# Altium footprint library TG102LE4G_A7682_240822.PcbLib: 38 footprints (part 2 of 3)
Each footprint in its own frame and in the unit in brackets; x right, y up, seen from the top. Pads: shape width x height; smd on the part's side, far side on the other; paste and mask are expansions set on the pad; w line width, h text height; cw(c..) or ccw(c..) is an arc to the next point about the centre after c.
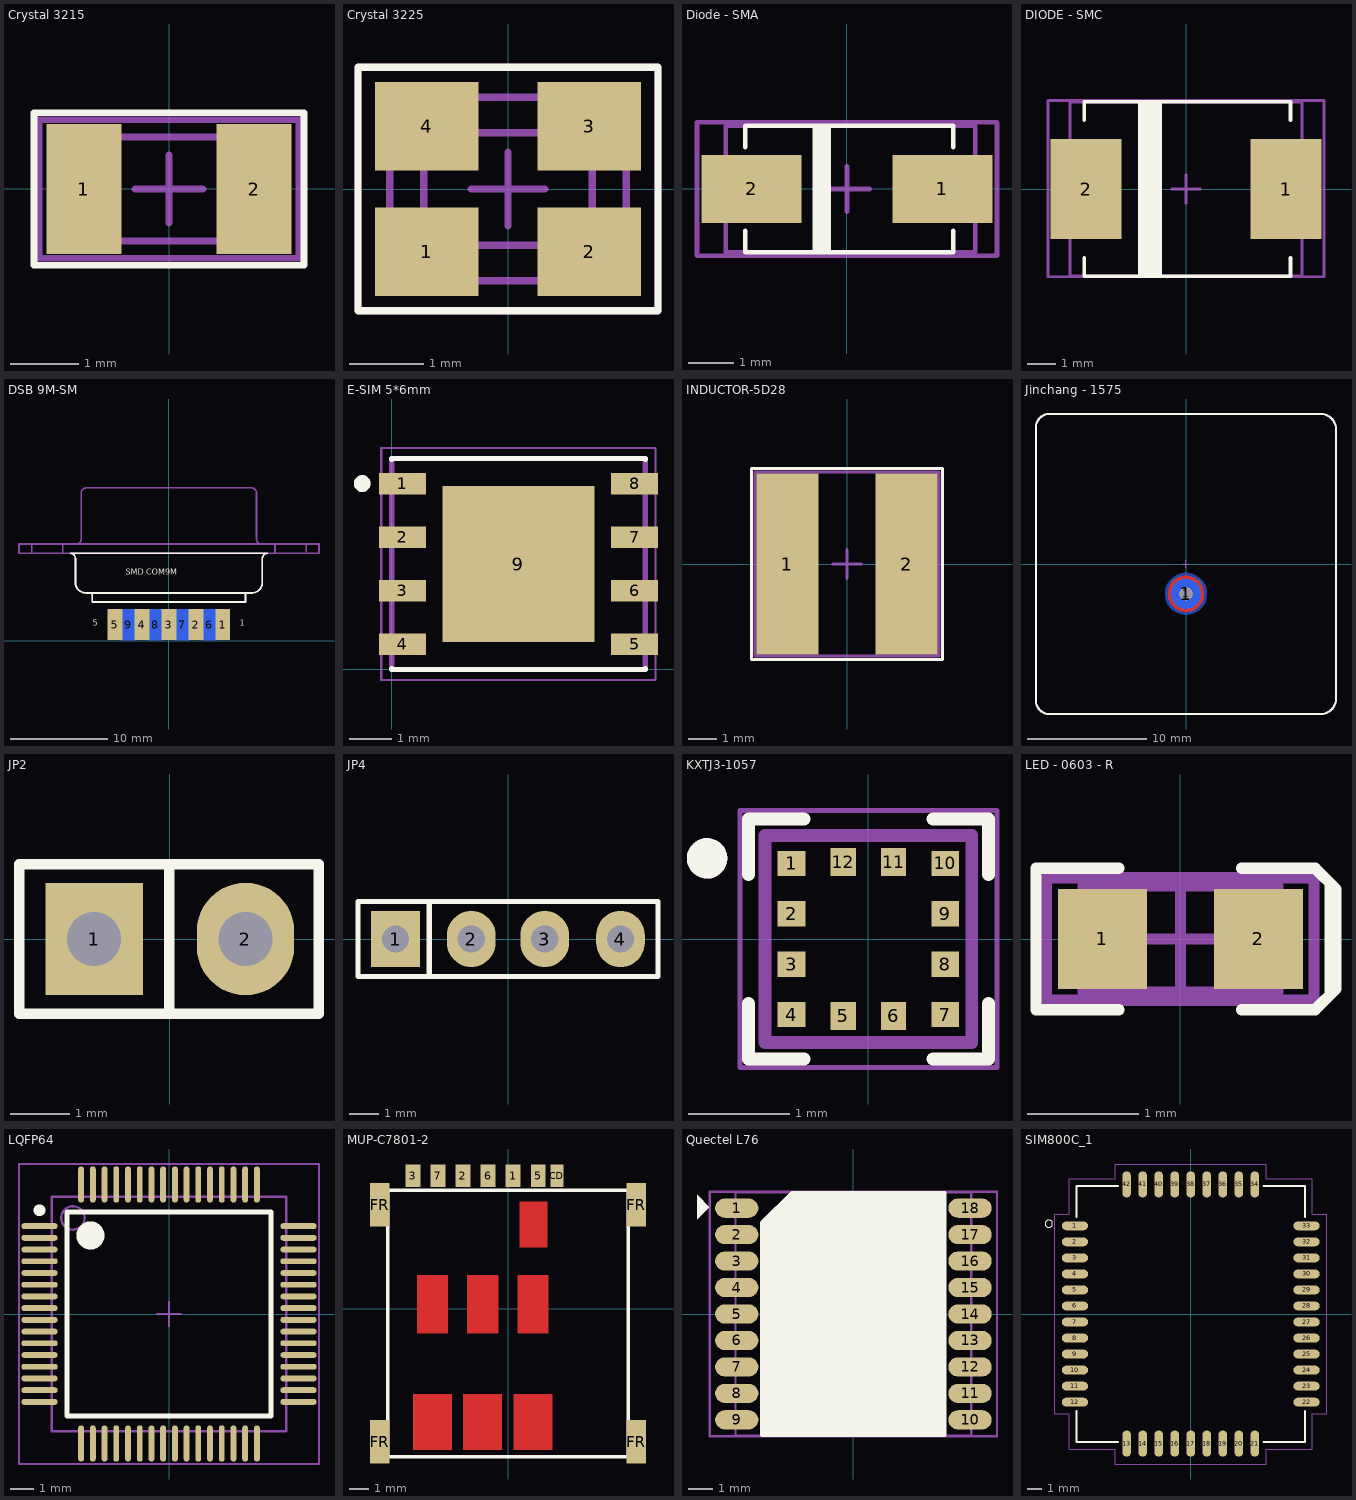
[diagram p1: the footprints below, top view; thin cyan lines are the x and y axes]

## Crystal 3215 [mm] "Surface Mount, crystal 2lead, 3.20mm x 1.50mm"
height 0.9
pads (2):
  rect 1.1x1.9 smd paste-0.05: 1(-1.25,0) 2(1.25,0)
Top Overlay:
  lines w0.1: -1.981,-1.118 1.981,-1.118 1.981,1.118 -1.981,1.118 -1.981,-1.118
Mechanical 13:
  lines w0.1: -1.524,-0.762 1.524,-0.762 1.524,0.762 -1.524,0.762 -1.524,-0.762
Mechanical 15:
  lines w0.1: -0.5,0 0.5,0 ; 0,-0.5 0,0.5 ; -1.905,-1.016 -1.905,1.016 1.905,1.016 1.905,-1.016 -1.905,-1.016
3D body "User Library-NDK_NX3215SA.STEP": height 0.8, standoff 0, extent -1.6,-0.75 1.6,0.75

## Crystal 3225 [mm] "Surface Mount,4-SMD, No Lead (DFN, LCC),3.20mm x 2.50mm"
height 1
pads (4):
  rect 1.4x1.2 smd paste-0.026: 1(-1.1,-0.85) 2(1.1,-0.85) 3(1.1,0.85) 4(-1.1,0.85)
Top Overlay:
  lines w0.1: -2.032,-1.651 -2.032,1.651 2.032,1.651 2.032,-1.651 -2.032,-1.651
Mechanical 13:
  lines w0.1: -1.6,-1.016 cw(c-1.6,-1.245) -1.372,-1.245 1.372,-1.245 cw(c1.6,-1.245) 1.6,-1.016 1.6,1.016 cw(c1.6,1.245) 1.372,1.245 -1.372,1.245 cw(c-1.6,1.245) -1.6,1.016 -1.6,-1.016 ; -1.143,-0.762 1.143,-0.762 1.143,0.762 -1.143,0.762 -1.143,-0.762
Mechanical 15:
  lines w0.1: -0.5,0 0.5,0 ; 0,-0.5 0,0.5 ; -2.032,-1.651 2.032,-1.651 2.032,1.651 -2.032,1.651 -2.032,-1.651
3D body "User Library-ABM8G.step": height 1.01, standoff 0, extent -1.6,-1.25 1.6,1.25

## Diode - SMA [mm] "Diode; 2 Leads"
pads (2):
  rect 2.2x1.5 smd: 1(2.1,0) 2(-2.1,0)
Top Overlay:
  rectangle: -0.711,-1.397 -0.356,1.397
  lines w0.1: -2.235,-0.914 -2.235,-1.397 2.337,-1.397 2.337,-0.914 ; -2.235,0.914 -2.235,1.397 2.337,1.397 2.337,0.914 ; -0.762,-1.397 -0.711,-1.397 -0.711,1.397
Mechanical 13:
  lines w0.1: -2.667,-1.397 -2.667,1.397 2.819,1.397 2.819,-1.397 -2.667,-1.397
Mechanical 15:
  lines w0.1: -0.5,0 0.5,0 ; 0,-0.5 0,0.5 ; -3.302,-1.473 -3.302,-1.448 -3.302,1.473 3.302,1.473 3.302,-1.448 3.302,-1.473 -3.302,-1.473
3D body "Diode - SMA.STEP": height 2.6, standoff 0.03, extent -2.674,-1.403 2.826,1.397

## DIODE - SMC [mm] "Diode; 2 Leads, 6.8x5.9mm"
pads (2):
  rect 2.5x3.5 smd: 1(3.5,0) 2(-3.5,0)
Top Overlay:
  rectangle: -1.676,-3.099 -0.838,3.048
  lines w0.127: -3.556,-2.413 -3.556,-3.048 3.658,-3.048 3.658,-2.413 ; -3.556,2.413 -3.556,3.048 3.658,3.048 3.658,2.413 ; -1.397,-3.048 -1.397,3.048
Mechanical 13:
  lines w0.1: -4.064,-3.048 4.064,-3.048 4.064,3.048 -4.064,3.048 -4.064,-3.048
Mechanical 15:
  lines w0.1: -0.5,0 0.5,0 ; 0,-0.5 0,0.5 ; -4.826,-3.073 4.826,-3.073 4.826,3.099 -4.724,3.099 -4.826,3.099 -4.826,-3.073
3D body "Diode - SMC.STEP": height 2.4, standoff 0.03, extent -4.065,-3.05 4.065,3.05

## DSB 9M-SM [mil] "Com 9 chan SMD,F"
height 296.46
pads (9):
  rect 60x125.98 smd: 1(218.11,66) 2(109.06,66) 3(0,66) 4(-109.06,66) 5(-218.11,66)
  rect 60x125.98 smd far side: 6(163.58,66) 7(54.53,66) 8(-54.53,66) 9(-163.58,66)
Top Overlay:
  lines w7: -377.95,236 -377.95,332.93 ; 377.95,236.95 377.95,334
  lines w7.01: -398.93,354.98 cw(c-399.46,333.46) -377.95,332.93 ; -395,354.98 400,354.98 ccw(c399.46,333.46) 377.95,334 ; -377.95,236 ccw(c-335.45,236.45) -335,193.95 335.95,193.95 ; -310,193.95 -310,157.73 310,157.73 ; 310,158 310,193 ; 335.95,194 ccw(c335.5,236.5) 378,236.95
  text "1" at 287,52.55 h39.37
  text "5" at -307.99,52.43 h39.37
  text "SMD COM9M" at -174.01,260.37 h39.37
Mechanical 13:
  lines w7: -377.95,236 -377.95,332.93 ; -333.07,619 333.07,619 ; 377.95,236.95 377.95,334
  lines w7.01: -554.92,354.98 -554.92,391.98 ; -428.94,357 -428.94,388 ; -398.93,354.98 cw(c-399.46,333.46) -377.95,332.93 ; -377.95,236 ccw(c-335.45,236.45) -335,193.95 335.95,193.95 ; -373.35,391.98 ccw(c-374.18,411.82) -354.35,412.65 -354.33,598.07 cw(c-333.24,597.91) -333.07,619 ; -310,193.95 -310,157.73 310,157.73 ; 310,158 310,193 ; 333.07,619 cw(c333.24,597.91) 354.33,598.07 354.33,411 ccw(c374.17,411.83) 375,392 ; 335.95,194 ccw(c335.5,236.5) 378,236.95 ; 377.95,334 cw(c399.46,333.46) 400,354.98 ; 428.94,358 428.94,389 ; 554.92,360 554.92,391 ; -606,355 -606,392 607,391.98 607,354.98 -325,354.98 -606,354.98
  text "SMD COM9M" at -174.01,260.37 h39.37
3D body "DB9 Straight.STEP": height 220.41, standoff -275.59, extent -606,20 607,619

## E-SIM 5*6mm [mm]
height 0.85
pads (9):
  rect 1.11x0.51 smd: 1(0.247,4.394) 2(0.247,3.124) 3(0.247,1.854) 4(0.247,0.584) 5(5.747,0.584) 6(5.747,1.854) 7(5.747,3.124) 8(5.747,4.394)
  rect 3.6x3.7 smd paste-3: 9(2.997,2.489)
Top Overlay:
  circle w0.2: c-0.703,4.394 r0.1
  lines w0.127: -0.003,0.009 -0.003,-0.011 5.997,-0.011 5.997,0.009 ; -0.003,4.969 -0.003,4.989 5.997,4.989 5.997,4.969
Top Paste:
  region: 4.352,2.714 3.222,2.714 3.222,3.894 4.352,3.894
  region: 2.772,1.084 1.642,1.084 1.642,2.264 2.772,2.264
  region: 2.772,2.714 1.642,2.714 1.642,3.894 2.772,3.894
  region: 4.352,1.084 3.222,1.084 3.222,2.264 4.352,2.264
Top 3D Body:
  circle w0.2: c-0.703,4.394 r0.1
  lines w0.127: -0.003,-0.011 -0.003,4.989 5.997,4.989 5.997,-0.011 -0.003,-0.011
Top Courtyard:
  lines w0.05: -0.253,-0.261 -0.253,5.239 6.247,5.239 6.247,-0.261 -0.253,-0.261
3D body "step_temp.STEP": height 0.82, standoff 0, extent -0.003,-0.011 5.997,4.989

## INDUCTOR-5D28 [mm] "Shielded Inductor 6x6mm"
pads (2):
  rect 2.15x6.3 smd: 1(-2.075,0) 2(2.075,0)
Top Overlay:
  lines w0.1: -3.327,-3.327 -3.302,-3.327 3.327,-3.327 3.327,3.327 -3.302,3.327 -3.327,3.327 -3.327,-3.327
Mechanical 13:
  lines w0.1: -3.2,-3.2 -3.2,3.2 3.2,3.2 3.2,-3.2 -3.2,-3.2
Mechanical 15:
  lines w0.1: -0.5,0 0.5,0 ; 0,-0.5 0,0.5 ; -3.327,-3.327 -3.327,3.327 3.327,3.327 3.327,-3.327 -3.327,-3.327
3D body "INDUCTOR 5D28.STEP": height 3, standoff 0, extent -3.104,-3 2.896,3

## Jinchang - 1575 [mm] "Anten GPS, 25x25x4mm"
height 4
pads (2):
  round 1.1 hole 1: 1(0,-2.5)
  round 2.5 smd far side: 1(0,-2.5)
Top Layer:
  pour cut-out: -1.5,-2.5 -1.5,-2.648 -1.442,-2.938 -1.329,-3.211 -1.165,-3.456 -0.956,-3.665 -0.711,-3.829 -0.438,-3.942 -0.148,-4 0,-4 0.148,-4 0.438,-3.942 0.711,-3.829 0.956,-3.665 1.165,-3.456 1.329,-3.211 1.442,-2.938 1.5,-2.648 1.5,-2.5 1.5,-2.352 1.442,-2.062 1.329,-1.789 1.165,-1.544 0.956,-1.335 0.711,-1.171 0.438,-1.058 0.148,-1 0,-1 -0.148,-1 -0.438,-1.058 -0.711,-1.171 -0.956,-1.335 -1.165,-1.544 -1.329,-1.789 -1.442,-2.062 -1.5,-2.352
Bottom Layer:
  pour cut-out: -1.75,-2.5 -1.75,-2.672 -1.683,-3.01 -1.551,-3.329 -1.359,-3.616 -1.116,-3.859 -0.829,-4.051 -0.51,-4.183 -0.172,-4.25 0,-4.25 0.172,-4.25 0.51,-4.183 0.829,-4.051 1.116,-3.859 1.359,-3.616 1.551,-3.329 1.683,-3.01 1.75,-2.672 1.75,-2.5 1.75,-2.328 1.683,-1.99 1.551,-1.671 1.359,-1.384 1.116,-1.141 0.829,-0.949 0.51,-0.817 0.172,-0.75 0,-0.75 -0.172,-0.75 -0.51,-0.817 -0.829,-0.949 -1.116,-1.141 -1.359,-1.384 -1.551,-1.671 -1.683,-1.99 -1.75,-2.328
Top Overlay:
  lines w0.178: -12.55,-11.176 -12.55,11.43 ; -12.55,-10.668 -12.55,-11.43 ccw(c-11.43,-11.43) -11.43,-12.55 -10.16,-12.55 ; -12.55,11.176 -12.55,11.43 ; -11.303,-12.55 11.28,-12.55 ; -10.795,12.55 -11.43,12.55 ; 10.668,-12.55 11.28,-12.55 ; 12.55,-10.795 12.55,-11.28 ; -12.55,11.43 cw(c-11.43,11.43) -11.43,12.55 ; -11.43,12.55 10.795,12.55 11.28,12.55 cw(c11.28,11.28) 12.55,11.28 12.55,11.049 12.55,-11.28 ; 11.28,-12.55 ccw(c11.28,-11.28) 12.55,-11.28
Mechanical 13:
  lines w0.178: -12.55,-11.176 -12.55,11.43 ; -12.55,-10.668 -12.55,-11.43 ccw(c-11.43,-11.43) -11.43,-12.55 -10.16,-12.55 ; -12.55,11.176 -12.55,11.43 ; -11.303,-12.55 11.28,-12.55 ; -10.795,12.55 -11.43,12.55 ; 10.668,-12.55 11.28,-12.55 ; 12.55,-10.795 12.55,-11.28 ; -12.55,11.43 cw(c-11.43,11.43) -11.43,12.55 ; -11.43,12.55 10.795,12.55 11.28,12.55 cw(c11.28,11.28) 12.55,11.28 12.55,11.049 12.55,-11.28 ; 11.28,-12.55 ccw(c11.28,-11.28) 12.55,-11.28
Mechanical 15:
  lines w0.1: -0.3,0 0.3,0 ; 0,-0.3 0,0.3
  lines w0.178: -12.55,-11.176 -12.55,11.43 ; -12.55,-10.668 -12.55,-11.43 ccw(c-11.43,-11.43) -11.43,-12.55 -10.16,-12.55 ; -12.55,11.176 -12.55,11.43 ; -11.303,-12.55 11.28,-12.55 ; -10.795,12.55 -11.43,12.55 ; 10.668,-12.55 11.28,-12.55 ; 12.55,-10.795 12.55,-11.28 ; -12.55,11.43 cw(c-11.43,11.43) -11.43,12.55 ; -11.43,12.55 10.795,12.55 11.28,12.55 cw(c11.28,11.28) 12.55,11.28 12.55,11.049 12.55,-11.28 ; 11.28,-12.55 ccw(c11.28,-11.28) 12.55,-11.28
3D body "Anten GPS-1575.STEP": height 5, standoff -3, extent -12.554,-12.4 12.446,12.6

## JP2 [mil] "Jumper 2, 2.54x2p"
height 200
pads (2):
  rect 65x75 hole 36.02: 1(-50.5,0)
  oval 65x75 hole 36.02: 2(50.5,0)
Top Overlay:
  lines w7: -0.5,-50 -0.5,49 ; -100.5,-50 99.5,-50 99.5,50 -100.5,50 -100.5,-50

## JP4 [mil] "Jumper 4, 2.54x4p"
height 200
pads (4):
  rect 65x75 hole 36.02: 1(-150,0)
  oval 65x75 hole 36.02: 2(-49,0) 3(49,0) 4(150,0)
Top Overlay:
  lines w7: -105,-50 -105,49 ; -200,-50 -200,50 200,50 200,-50 -200,-50

## KXTJ3-1057 [mm]
height 2.4
pads (12):
  rect 0.275x0.25 smd: 1(-0.763,0.75) 2(-0.763,0.25) 3(-0.763,-0.25) 4(-0.763,-0.75) 7(0.763,-0.75) 8(0.763,-0.25) 9(0.763,0.25) 10(0.763,0.75)
  rect 0.25x0.275 smd: 5(-0.25,-0.763) 6(0.25,-0.763) 11(0.25,0.763) 12(-0.25,0.763)
Top Overlay:
  circle w0.2: c-1.6,0.8 r0.1
  lines w0.127: -1.19,-0.64 -1.19,-1.19 -0.64,-1.19 ; -1.19,0.64 -1.19,1.19 -0.64,1.19 ; 0.64,-1.19 1.19,-1.19 1.19,-0.64 ; 0.64,1.19 1.19,1.19 1.19,0.64
Mechanical 13:
  circle w0.2: c-1.6,0.8 r0.1
  lines w0.127: -1.025,-1.025 1.025,-1.025 1.025,1.025 -1.025,1.025 -1.025,-1.025
Mechanical 15:
  lines w0.05: -1.275,-1.275 1.275,-1.275 1.275,1.275 -1.275,1.275 -1.275,-1.275
3D body "KXTJ3-1057--3DModel-STEP-56544.STEP": height 1, standoff 0, extent -1,-0.9 1,1.1

## LED - 0603 - R [mm] "Chip Capacitor, Body 1.6x0.8mm, IPC High Density"
height 1.3
pads (2):
  rect 0.8x0.9 smd: 1(-0.7,0) 2(0.7,0)
Top Overlay:
  rectangle: 1.295,-0.499 1.397,0.508
  lines w0.1: -0.55,-0.635 -1.295,-0.635 -1.295,0.635 -0.55,0.635 ; 0.55,-0.635 1.092,-0.635 1.21,-0.635 1.397,-0.448 1.397,0.448 1.21,0.635 1.092,0.635 0.55,0.635
Mechanical 13:
  lines w0.1: -0.875,-0.475 -0.875,0.475 0.875,0.475 0.875,-0.475 -0.875,-0.475
Mechanical 15:
  lines w0.1: -0.475,0 0.475,0 ; 0,-0.475 0,0.475 ; -1.2,-0.55 -1.2,0.55 1.2,0.55 1.2,-0.55 -1.2,-0.55
3D body "LED_0603_R.STEP": height 0.6, standoff 0, extent -0.8,-0.4 0.8,0.4

## LQFP64 [mm] "Thin QFP, 64-Leads, Body 10x10mm, Pitch 0.5mm, IPC High Density"
height 1.4
pads (64):
  oval 1.55x0.25 smd: 1(-5.525,3.75) 2(-5.525,3.25) 3(-5.525,2.75) 4(-5.525,2.25) 5(-5.525,1.75) 6(-5.525,1.25) 7(-5.525,0.75) 8(-5.525,0.25) 9(-5.525,-0.25) 10(-5.525,-0.75) 11(-5.525,-1.25) 12(-5.525,-1.75) 13(-5.525,-2.25) 14(-5.525,-2.75) 15(-5.525,-3.25) 16(-5.525,-3.75) 33(5.525,-3.75) 34(5.525,-3.25) 35(5.525,-2.75) 36(5.525,-2.25) 37(5.525,-1.75) 38(5.525,-1.25) 39(5.525,-0.75) 40(5.525,-0.25) 41(5.525,0.25) 42(5.525,0.75) 43(5.525,1.25) 44(5.525,1.75) 45(5.525,2.25) 46(5.525,2.75) 47(5.525,3.25) 48(5.525,3.75)
  oval 0.25x1.55 smd: 17(-3.75,-5.525) 18(-3.25,-5.525) 19(-2.75,-5.525) 20(-2.25,-5.525) 21(-1.75,-5.525) 22(-1.25,-5.525) 23(-0.75,-5.525) 24(-0.25,-5.525) 25(0.25,-5.525) 26(0.75,-5.525) 27(1.25,-5.525) 28(1.75,-5.525) 29(2.25,-5.525) 30(2.75,-5.525) 31(3.25,-5.525) 32(3.75,-5.525) 49(3.75,5.525) 50(3.25,5.525) 51(2.75,5.525) 52(2.25,5.525) 53(1.75,5.525) 54(1.25,5.525) 55(0.75,5.525) 56(0.25,5.525) 57(-0.25,5.525) 58(-0.75,5.525) 59(-1.25,5.525) 60(-1.75,5.525) 61(-2.25,5.525) 62(-2.75,5.525) 63(-3.25,5.525) 64(-3.75,5.525)
Top Overlay:
  circle w0.25: c-5.525,4.425 r0.125
  circle w0.6: c-3.35,3.35 r0.3
  lines w0.2: -4.35,-4.35 -4.35,4.35 4.35,4.35 4.35,-4.35 -4.35,-4.35
Mechanical 13:
  circle w0.1: c-4.1,4.1 r0.5
  lines w0.1: -5,-5 -5,5 5,5 5,-5 -5,-5
Mechanical 15:
  lines w0.1: -0.5,0 0.5,0 ; 0,-0.5 0,0.5 ; -6.4,-6.4 -6.4,6.4 6.4,6.4 6.4,-6.4 -6.4,-6.4
3D body "PQFP 64.STEP": height 1.02, standoff -0.09, extent -5.79,-5.791 5.785,5.79

## MUP-C7801-2 [mm]
pads (11):
  rect 0.75x1.13 smd: 1(0.26,6.743) 2(-2.28,6.743) 3(-4.82,6.743) 5(1.53,6.743) 6(-1.01,6.743) 7(-3.55,6.743)
  rect 0.65x1.13 smd: CD(2.48,6.743)
  rect 1x2.2 smd: FR(-6.5,-6.742) FR(-6.5,5.258) FR(6.5,-6.742) FR(6.5,5.258)
Top Layer:
  pour cut-out: 0.285,-7.143 2.235,-7.143 2.235,-4.343 0.285,-4.343
  pour cut-out: -2.255,-7.143 -0.305,-7.143 -0.305,-4.343 -2.255,-4.343
  pour cut-out: 0.485,-1.242 2.035,-1.242 2.035,1.707 0.485,1.707
  pour cut-out: -2.055,-1.242 -2.055,1.707 -0.505,1.707 -0.505,-1.242
  pour cut-out: -4.595,-1.242 -3.045,-1.242 -3.045,1.707 -4.595,1.707
  pour cut-out: -4.795,-4.343 -2.845,-4.343 -2.845,-7.143 -4.795,-7.143
  pour cut-out: 0.6,3.107 2,3.107 2,5.407 0.6,5.407
Top Overlay:
  lines w0.178: -6.1,-7.492 6.1,-7.492 6.1,6.008 -6.1,6.008 -6.1,-7.492
3D body "SIM8066-6-1-14-01-A--3DModel-STEP-56544.STEP": height 1.44, standoff -0.37, extent -6.545,-7.44 6.545,7.14

## Quectel L76 [mil] "Quectel module GPS, 18 lead, 9.7mmx10.1mm"
height 98.43
pads (18):
  rrect100% 70.87x31.5 smd: 1(-190.94,173.23) 2(-190.94,129.92) 3(-190.94,86.61) 4(-190.94,43.31) 5(-190.94,0) 6(-190.94,-43.31) 7(-190.94,-86.61) 8(-190.94,-129.92) 9(-190.94,-173.23) 10(190.94,-173.23) 11(190.94,-129.92) 12(190.94,-86.61) 13(190.94,-43.31) 14(190.94,0) 15(190.94,43.31) 16(190.94,86.61) 17(190.94,129.92) 18(190.94,173.23)
Top Overlay:
  region: -256,155 -236,175 -256,195
  region: -150,-198.82 150,-198.82 150,198.82 -101.18,198.82 -150,150
  lines w5: -150,-198.82 -150,150 -101.18,198.82 150,198.82 150,-198.82 -150,-198.82
Mechanical 13:
  lines w3.94: -192.91,-198.99 192.91,-198.99 192.91,198.01 ; -192.91,-198.81 -192.91,198.83 ; -192.91,199.03 192.91,199.03
Mechanical 15:
  lines w3.94: -11.81,0 11.81,0 ; 0,-11.81 0,11.81 ; -235,-200 235,-200 235,200 -235,200 -235,-200
3D body "QUECTEL L76.STEP": height 99.21, standoff 0, extent -190.94,-198.82 190.95,198.81

## SIM800C_1 [mm] "GSM/GPRS solution in a SMT type, 42 lead, 17.6*15.7*2.3mm"
height 2.3
pads (42):
  oval 1.8x0.6 smd: 1(-7.95,6.05) 2(-7.95,4.95) 3(-7.95,3.85) 4(-7.95,2.75) 5(-7.95,1.65) 6(-7.95,0.55) 7(-7.95,-0.55) 8(-7.95,-1.65) 9(-7.95,-2.75) 10(-7.95,-3.85) 11(-7.95,-4.95) 12(-7.95,-6.05) 22(7.95,-6.05) 23(7.95,-4.95) 24(7.95,-3.85) 25(7.95,-2.75) 26(7.95,-1.65) 27(7.95,-0.55) 28(7.95,0.55) 29(7.95,1.65) 30(7.95,2.75) 31(7.95,3.85) 32(7.95,4.95) 33(7.95,6.05)
  oval 0.6x1.8 smd: 13(-4.4,-8.9) 14(-3.3,-8.9) 15(-2.2,-8.9) 16(-1.1,-8.9) 17(0,-8.9) 18(1.1,-8.9) 19(2.2,-8.9) 20(3.3,-8.9) 21(4.4,-8.9) 34(4.4,8.9) 35(3.3,8.9) 36(2.2,8.9) 37(1.1,8.9) 38(0,8.9) 39(-1.1,8.9) 40(-2.2,8.9) 41(-3.3,8.9) 42(-4.4,8.9)
Top Overlay:
  circle w0: c-9.75,6.2 r0.254
  lines w0.127: -7.85,-6.65 -7.85,-8.8 -5,-8.8 ; -7.85,6.65 -7.85,8.8 -5,8.8 ; 5,-8.8 7.85,-8.8 7.85,-6.65 ; 5,8.8 7.85,8.8 7.85,6.65
Mechanical 15:
  lines w0.05: -9.35,-6.85 -9.35,6.85 -8.35,6.85 -8.35,9.3 -5.2,9.3 -5.2,10.3 5.2,10.3 5.2,9.3 8.35,9.3 8.35,6.85 9.35,6.85 9.35,-6.85 8.35,-6.85 8.35,-9.3 5.2,-9.3 5.2,-10.3 -5.2,-10.3 -5.2,-9.3 -8.35,-9.3 -8.35,-6.85 -9.35,-6.85
3D body "step_temp.STEP": height 2.5, standoff 0, extent -7.85,-8.8 7.85,8.8